# Altium footprint library hphonglib.PcbLib: 703 footprints (part 44 of 44)
Each footprint in its own frame and in the unit in brackets; x right, y up, seen from the top. Pads: shape width x height; smd on the part's side, far side on the other; paste and mask are expansions set on the pad; w line width, h text height; cw(c..) or ccw(c..) is an arc to the next point about the centre after c.
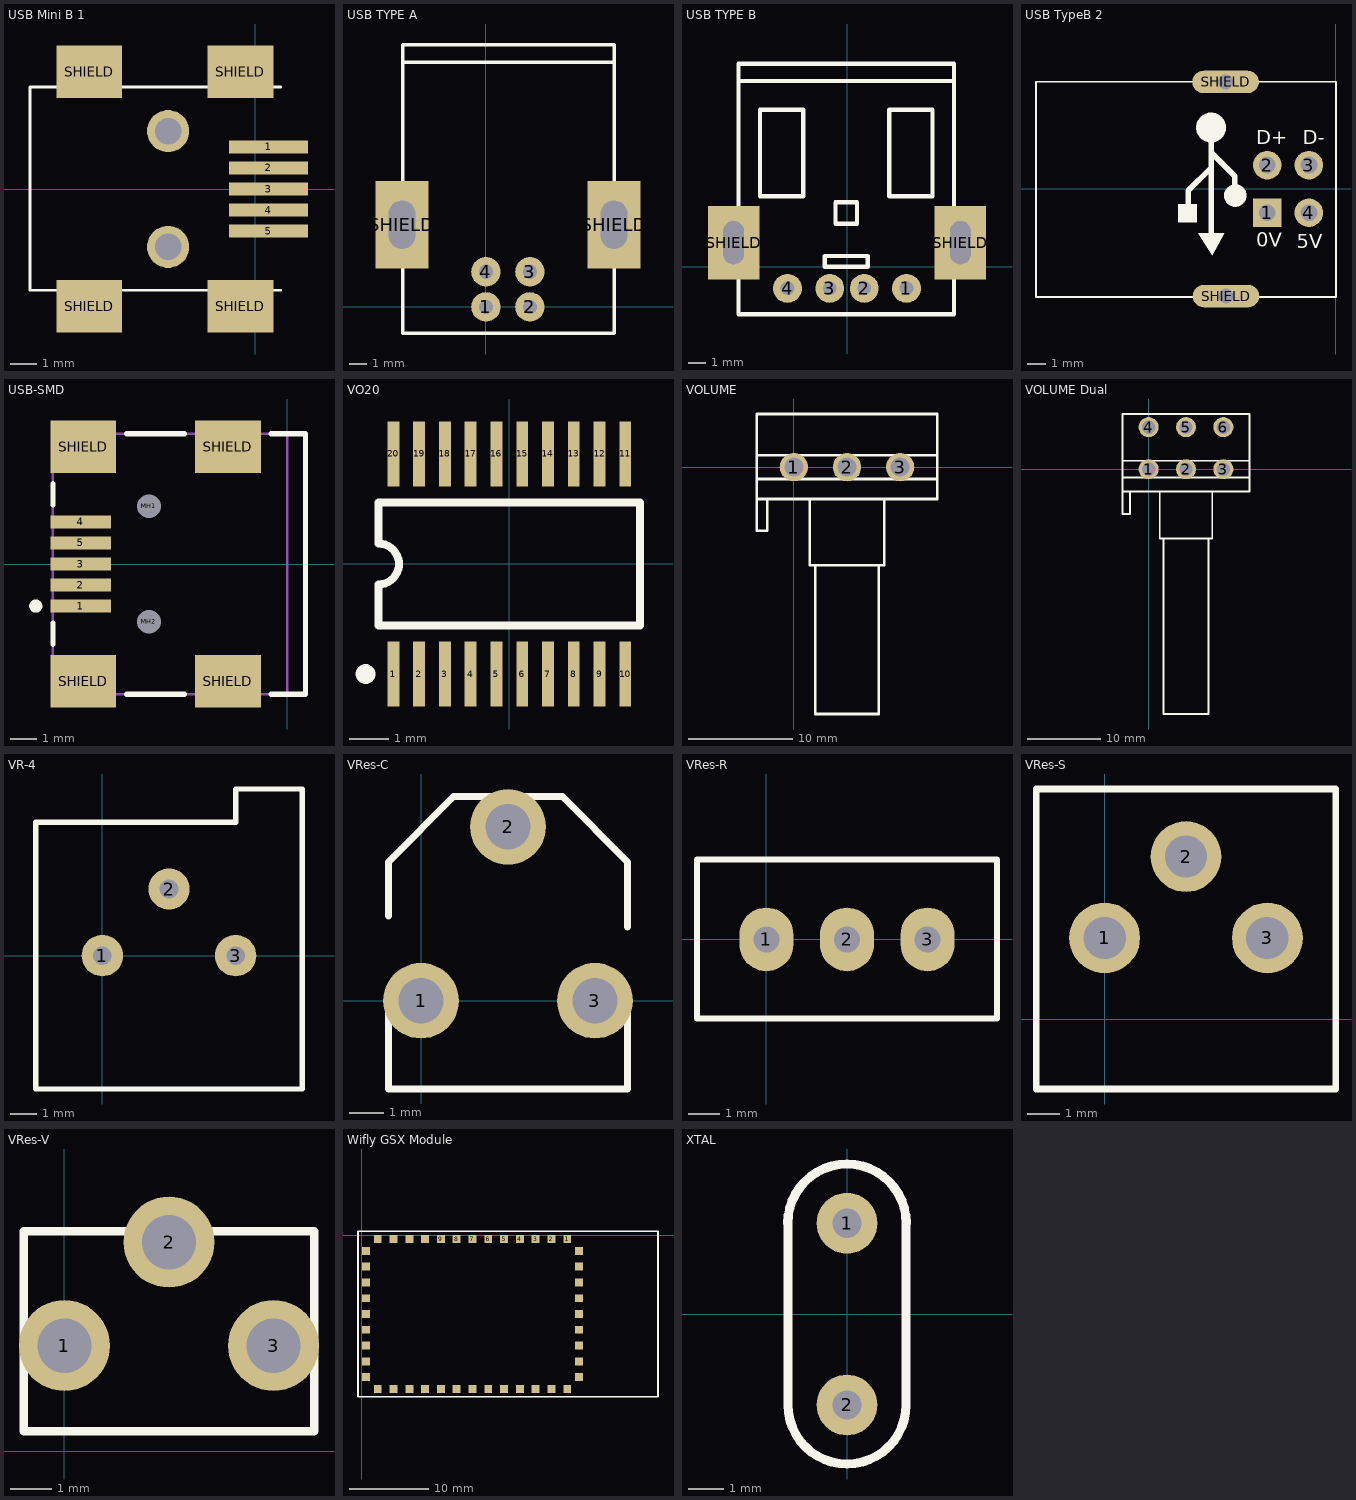
[diagram p43: the footprints below, top view; thin cyan lines are the x and y axes]

## USB Mini B 1 [mm] "USB Male Mini Type B Conn"
pads (11):
  rect 3x0.5 smd: 1(0.5,1.6) 2(0.5,0.8) 3(0.5,0) 4(0.5,-0.8) 5(0.5,-1.6)
  rect 2.5x2 smd: SHIELD(-6.318,-4.45) SHIELD(-6.318,4.45) SHIELD(-0.568,-4.45) SHIELD(-0.568,4.45)
  round 1.6 hole 1: ""(-3.318,-2.2) ""(-3.318,2.2)
Top Overlay:
  lines w0.1: 0.957,-3.85 -8.568,-3.85 -8.568,3.875 0.957,3.875
  text "." at 1.325,2.6 h0.5
3D body: height 3.95, standoff -1, extent -9.175,-5.375 0.025,5.325

## USB TYPE A [mil] "Connector; USB; Type A; Solder Pad 35mil"
pads (6):
  round 67 hole 32: 1(0,0) 2(100,0) 3(100,80) 4(0,80)
  rect 120x200 hole 60 slot 110 at 90 deg: SHIELD(-191.07,186.88) SHIELD(291.23,186.88)
Top Overlay:
  lines w8: -187.07,557 290.08,557 ; 288.08,-60 -189.07,-60 ; -189.07,-60 291.23,-60 291.23,596.44 -189.07,596.44 -189.07,-60
3D body: height 435, standoff -141.49, extent -241.22,-57.29 341.32,592.32

## USB TYPE B [mil] "Connector; USB; Type B; Solder Pad 35mil"
pads (6):
  round 67 hole 32: 1(138,-50) 2(40,-50) 3(-40,-50) 4(-138,-50)
  rect 120x170 hole 48 slot 100 at 90 deg: SHIELD(-263,56) SHIELD(263,56)
Top Overlay:
  lines w10: -251.77,-100 -251.77,431 248.23,431 248.23,-100 ; -251.77,-110 -251.77,471 248.23,471 248.23,-110 -251.77,-110 ; -201.77,164 -201.77,364 -101.77,364 -101.77,164 -201.77,164 ; -51.77,0 -51.77,25 48.23,25 48.23,0 -1.77,0 -51.77,0 ; -26.77,100 23.23,100 23.23,150 -26.77,150 -26.77,100 ; 98.23,164 98.23,364 198.23,364 198.23,164 98.23,164
3D body: height 275.59, standoff -151.76, extent -311.02,-105 311.02,465.87

## USB TypeB 2 [mm] "USB Male Type B Connector"
pads (6):
  rect 1.524x1.524 hole 0.9: 1(-3.672,-1.27)
  round 1.524 hole 0.9: 2(-3.672,1.27) 3(-1.449,1.27) 4(-1.449,-1.27)
  rrect100% 3.556x1.2 hole 0.8: SHIELD(-5.894,5.715) SHIELD(-5.875,-5.725)
Top Overlay:
  circle w0.6: c-5.382,-0.356 r0.3
  circle w0.8: c-6.674,3.277 r0.4
  region: -8.433,-0.813 -8.433,-1.803 -7.417,-1.803 -7.417,-0.813
  region: -6.617,-3.531 -7.353,-2.362 -5.956,-2.362
  lines w0.1: -16.025,-5.775 -16.025,5.725 0,5.725 0,-5.775 -16.025,-5.775
  lines w0.2: -6.655,1.876 -6.629,1.876 -6.604,1.876
  lines w0.3: -7.899,-0.864 -7.899,-0.127 ; -7.899,-0.102 -6.655,1.143 ; -6.655,-2.464 -6.655,2.718 ; -6.604,1.876 -5.41,0.683 -5.41,-0.279
  lines w0.8: -6.934,5.725 -4.826,5.725 ; -6.915,-5.715 -4.807,-5.715
  text "0V" at -4.267,-3.099 h0.76
  text "D-" at -1.778,2.388 h0.76
  text "D+" at -4.267,2.388 h0.76
  text "5V" at -2.108,-3.175 h0.76
Bottom Overlay:
  circle w0.8: c-6.699,3.277 r0.4
  circle w0.6: c-5.407,-0.356 r0.3
  region: -8.458,-0.813 -8.458,-1.803 -7.442,-1.803 -7.442,-0.813
  region: -6.642,-3.531 -7.379,-2.362 -5.982,-2.362
  lines w0.1: -16.025,-5.775 -16.025,5.725 ; 0,-5.775 0,5.725 ; -16.025,-5.766 -16.025,5.725 ; -16.025,-5.766 0,-5.766 ; -16.025,-5.766 0,-5.766 ; -16.025,5.725 0,5.725 ; -16.025,5.725 0,5.725 ; 0,-5.766 0,5.725
  lines w0.3: -7.925,-0.864 -7.925,-0.127 ; -7.925,-0.102 -6.68,1.143 ; -6.68,-2.464 -6.68,2.718 ; -6.629,1.876 -5.436,0.683 -5.436,-0.279
3D body: height 11.5, standoff -3.92, extent -16.594,-7.442 0.406,7.441

## USB-SMD [mm] "Connector; USB2.0, Type B, SM; 5 Position; Right Angle"
height 3.9
pads (11):
  rect 2.3x0.5 smd: 1(-7.85,-1.6) 2(-7.85,-0.8) 3(-7.85,0) 4(-7.85,1.6) 5(-7.85,0.8)
  round 0.6 hole 0.9 unplated: MH1(-5.25,2.2) MH2(-5.25,-2.2)
  rect 2.5x2 smd: SHIELD(-7.75,-4.45) SHIELD(-7.75,4.45) SHIELD(-2.25,-4.45) SHIELD(-2.25,4.45)
Top Overlay:
  circle w0.25: c-9.55,-1.6 r0.125
  lines w0.2: -8.9,-3.05 -8.9,-2.25 ; -8.9,2.25 -8.9,3.05 ; -6.1,-4.95 -3.9,-4.95 ; -6.1,4.95 -3.9,4.95 ; -0.6,-4.95 0.7,-4.95 0.7,4.95 -0.6,4.95
Mechanical 1:
  lines w0.1: 0,-4.95 0,4.95
  text "PCB Edge" at 0.432,-4.036 h0.25
Mechanical 13:
  lines w0.1: -8.9,-4.95 0.7,-4.95 0.7,4.95 -8.9,4.95 -8.9,-4.95
3D body: height 3.98, standoff -0.95, extent -8.536,-5.102 0.714,4.798

## VO20 [mm]
pads (20):
  rect 0.3x1.65 smd: 1(-2.929,-2.778) 2(-2.279,-2.778) 3(-1.629,-2.778) 4(-0.979,-2.778) 5(-0.329,-2.778) 6(0.321,-2.778) 7(0.971,-2.778) 8(1.621,-2.778) 9(2.271,-2.778) 10(2.921,-2.778) 11(2.921,2.772) 12(2.271,2.772) 13(1.621,2.772) 14(0.971,2.772) 15(0.321,2.772) 16(-0.329,2.772) 17(-0.979,2.772) 18(-1.629,2.772) 19(-2.279,2.772) 20(-2.929,2.772)
Top Overlay:
  circle w0.25: c-3.629,-2.778 r0.125
  lines w0.2: -3.304,-1.553 3.296,-1.553 3.296,1.547 -3.304,1.547 -3.304,0.514 cw(c-3.304,-0.003) -3.304,-0.519 -3.304,-1.553
3D body: height 0.51, standoff 0, extent 2.795,1.519 3.049,3.551
3D body: height 0.51, standoff 0, extent 2.145,1.519 2.399,3.551
3D body: height 0.51, standoff 0, extent 1.495,1.519 1.749,3.551
3D body: height 0.51, standoff 0, extent 0.845,1.519 1.099,3.551
3D body: height 0.51, standoff 0, extent 0.195,1.519 0.449,3.551
3D body: height 0.51, standoff 0, extent -0.455,1.519 -0.201,3.551
3D body: height 0.51, standoff 0, extent -1.105,1.519 -0.851,3.551
3D body: height 0.51, standoff 0, extent -1.755,1.519 -1.501,3.551
3D body: height 0.51, standoff 0, extent -2.405,1.519 -2.151,3.551
3D body: height 0.51, standoff 0, extent -3.055,1.519 -2.801,3.551
3D body: height 0.51, standoff 0, extent -3.056,-3.556 -2.802,-1.524
3D body: height 0.51, standoff 0, extent -2.406,-3.556 -2.152,-1.524
3D body: height 0.51, standoff 0, extent -1.756,-3.556 -1.502,-1.524
3D body: height 0.51, standoff 0, extent -1.106,-3.556 -0.852,-1.524
3D body: height 0.51, standoff 0, extent -0.456,-3.556 -0.202,-1.524
3D body: height 0.51, standoff 0, extent 0.194,-3.556 0.448,-1.524
3D body: height 0.51, standoff 0, extent 0.844,-3.556 1.098,-1.524
3D body: height 0.51, standoff 0, extent 1.494,-3.556 1.748,-1.524
3D body: height 0.51, standoff 0, extent 2.144,-3.556 2.398,-1.524
3D body: height 0.51, standoff 0, extent 2.794,-3.556 3.048,-1.524
3D body: height 1.52, standoff 0, extent -3.302,-1.524 3.302,1.524

## VOLUME [mil] "Potentiometer; Volume; 3 Leads; Circle; Solder pad 35mil"
pads (3):
  round 107 hole 72: 1(0,0) 2(200,0) 3(400,0)
Top Overlay:
  lines w10: -140,-120 540,-120 540,200 -140,200 -140,-240 -100,-240 -100,-120 ; -140,-45 540,-45 ; -140,45 540,45 ; 60,-120 60,-370 340,-370 340,-120 ; 80,-370 80,-930 320,-930 320,-370
3D body: height 789.35, standoff -180, extent -110,-811.21 510,195.01

## VOLUME Dual [mil] "Potentiometer; Volume; 2-channel; 6 Leads; Circle; Solder pad 35mil"
pads (6):
  round 107 hole 72: 1(0,0) 2(200,0) 3(400,0) 4(0,225) 5(200,225) 6(400,225)
Top Overlay:
  lines w10: -140,-120 540,-120 540,295 -140,295 -140,-240 -100,-240 -100,-120 ; -140,-45 540,-45 ; -140,45 540,45 ; 60,-120 60,-370 340,-370 340,-120 ; 80,-370 80,-1308 320,-1308 320,-370
3D body: height 834.65, standoff -129.92, extent -134.64,-1313.4 534.65,294.87

## VR-4 [mil]
pads (3):
  round 62 hole 28: 1(0,0) 2(100,100) 3(200,0)
Top Overlay:
  lines w8: -100,-200 300,-200 300,250 200,250 200,200 -100,200 -100,-200

## VRes-C [mil] "Potentiometer; 3 Leads; Circle; Solder pad 35mil"
pads (3):
  round 87 hole 52: 1(0,0) 2(100,200) 3(200,0)
Top Overlay:
  lines w8: -37.5,-90.23 -37.5,-2.73 -37.5,-101.5 237.5,-101.5 237.5,9.77 237.5,-90.23 ; -37.5,159.77 -37.5,97.27 -37.5,159.77 ; -37.5,159.77 37.5,234.77 ; -37.5,159.77 37.5,234.77 ; 37.5,234.77 162.5,234.77 ; 37.5,234.77 162.5,234.77 ; 162.5,234.77 237.5,159.77 ; 162.5,234.77 237.5,159.77 ; 237.5,159.77 237.5,84.77 237.5,159.77
3D body: height 300, standoff -119.49, extent -34.55,-96.87 233.56,228

## VRes-R [mil] "Potentiometer; 3 Leads; Rectangle; Solder pad 35mil"
pads (3):
  oval 67x79 hole 32: 1(0,0) 2(100,0) 3(200,0)
Top Overlay:
  lines w7.87: -86,-98 286,-98 286,99 -86,99 -86,-98
3D body: height 474.25, standoff -214.73, extent -81.1,-94 281.1,94.98

## VRes-S [mil] "Potentiometer; 3 Leads; Square; Solder pad 35mil"
pads (3):
  round 87 hole 52: 1(0,100) 2(100,200) 3(200,100)
Top Overlay:
  lines w8: -84,-85.5 284,-85.5 284,283 -84,283 -84,-85.5
3D body: height 300, standoff -87.01, extent -87.6,-89.2 287.6,286

## VRes-V [mil] "Potentiometer; 3 Leads; Vertical; Solder pad 35mil"
pads (3):
  round 87 hole 52: 1(0,101) 2(100,200) 3(200,101)
Top Overlay:
  lines w8: -39,19 239,19 239,210.5 -39,210.5 -39,19
3D body: height 330.71, standoff -75, extent -34.05,22.84 234.06,205.91

## Wifly GSX Module [mm] "Wifly GSX Module"
pads (44):
  rect 1x1 smd: 1(26,-0.5) 2(24,-0.5) 3(22,-0.5) 4(20,-0.5) 5(18,-0.5) 6(16,-0.5) 7(14,-0.5) 8(12,-0.5) 9(10,-0.5) 10(8,-0.5) 11(6,-0.5) 12(4,-0.5) 13(2,-0.5) 14(0.5,-2) 15(0.5,-4) 16(0.5,-6) 17(0.5,-8) 18(0.5,-10) 19(0.5,-12) 20(0.5,-14) 21(0.5,-16) 22(0.5,-18) 23(2,-19.5) 24(4,-19.5) 25(6,-19.5) 26(8,-19.5) 27(10,-19.5) 28(12,-19.5) 29(14,-19.5) 30(16,-19.5) 31(18,-19.5) 32(20,-19.5) 33(22,-19.5) 34(24,-19.5) 35(26,-19.5) 36(27.5,-18) 37(27.5,-16) 38(27.5,-14) 39(27.5,-12) 40(27.5,-10) 41(27.5,-8) 42(27.5,-6) 43(27.5,-4) 44(27.5,-2)
Top Overlay:
  lines w0.2: -0.5,-20.5 -0.5,0.5 37.5,0.5 37.5,-20.5 -0.5,-20.5
3D body: height 2, standoff 0.01, extent 0,-20 37,0
3D body: height 2, standoff 2, extent 28.032,-1.153 29.093,-0.117
3D body: height 4, standoff 1.99, extent 31.898,-13.242 35.898,-1.742
3D body: height 3.5, standoff 1.99, extent 0.5,-19.5 27.5,-0.5
3D body: height 2.6, standoff 1.9, extent 33.262,-18.953 35.212,-16.953
3D body: height 3.3, standoff 2, extent 33.478,-18.703 34.991,-17.19
3D body: height 3.5, standoff 2, extent 34.112,-18.078 34.362,-17.828

## XTAL [mil] "Crystal, Thru-Hole; 2 Leads; Body 3.1 x 8.2 mm (Dia.xH); Solder pad 35mil"
height 322.83
pads (2):
  round 67 hole 32: 1(0,100) 2(0,-100)
Top Overlay:
  lines w10: -65.19,100 cw(c0,100) 65.19,100 ; -65,100 -65,-100 ccw(c0,-100) 65,-100 65,100
3D body: height 138.8, standoff -156.48, extent -91.57,-223.42 91.5,223.43